# Altium footprint library BBC_Connectors.PcbLib: 142 footprints (part 7 of 9)
Each footprint in its own frame and in the unit in brackets; x right, y up, seen from the top. Pads: shape width x height; smd on the part's side, far side on the other; paste and mask are expansions set on the pad; w line width, h text height; cw(c..) or ccw(c..) is an arc to the next point about the centre after c.
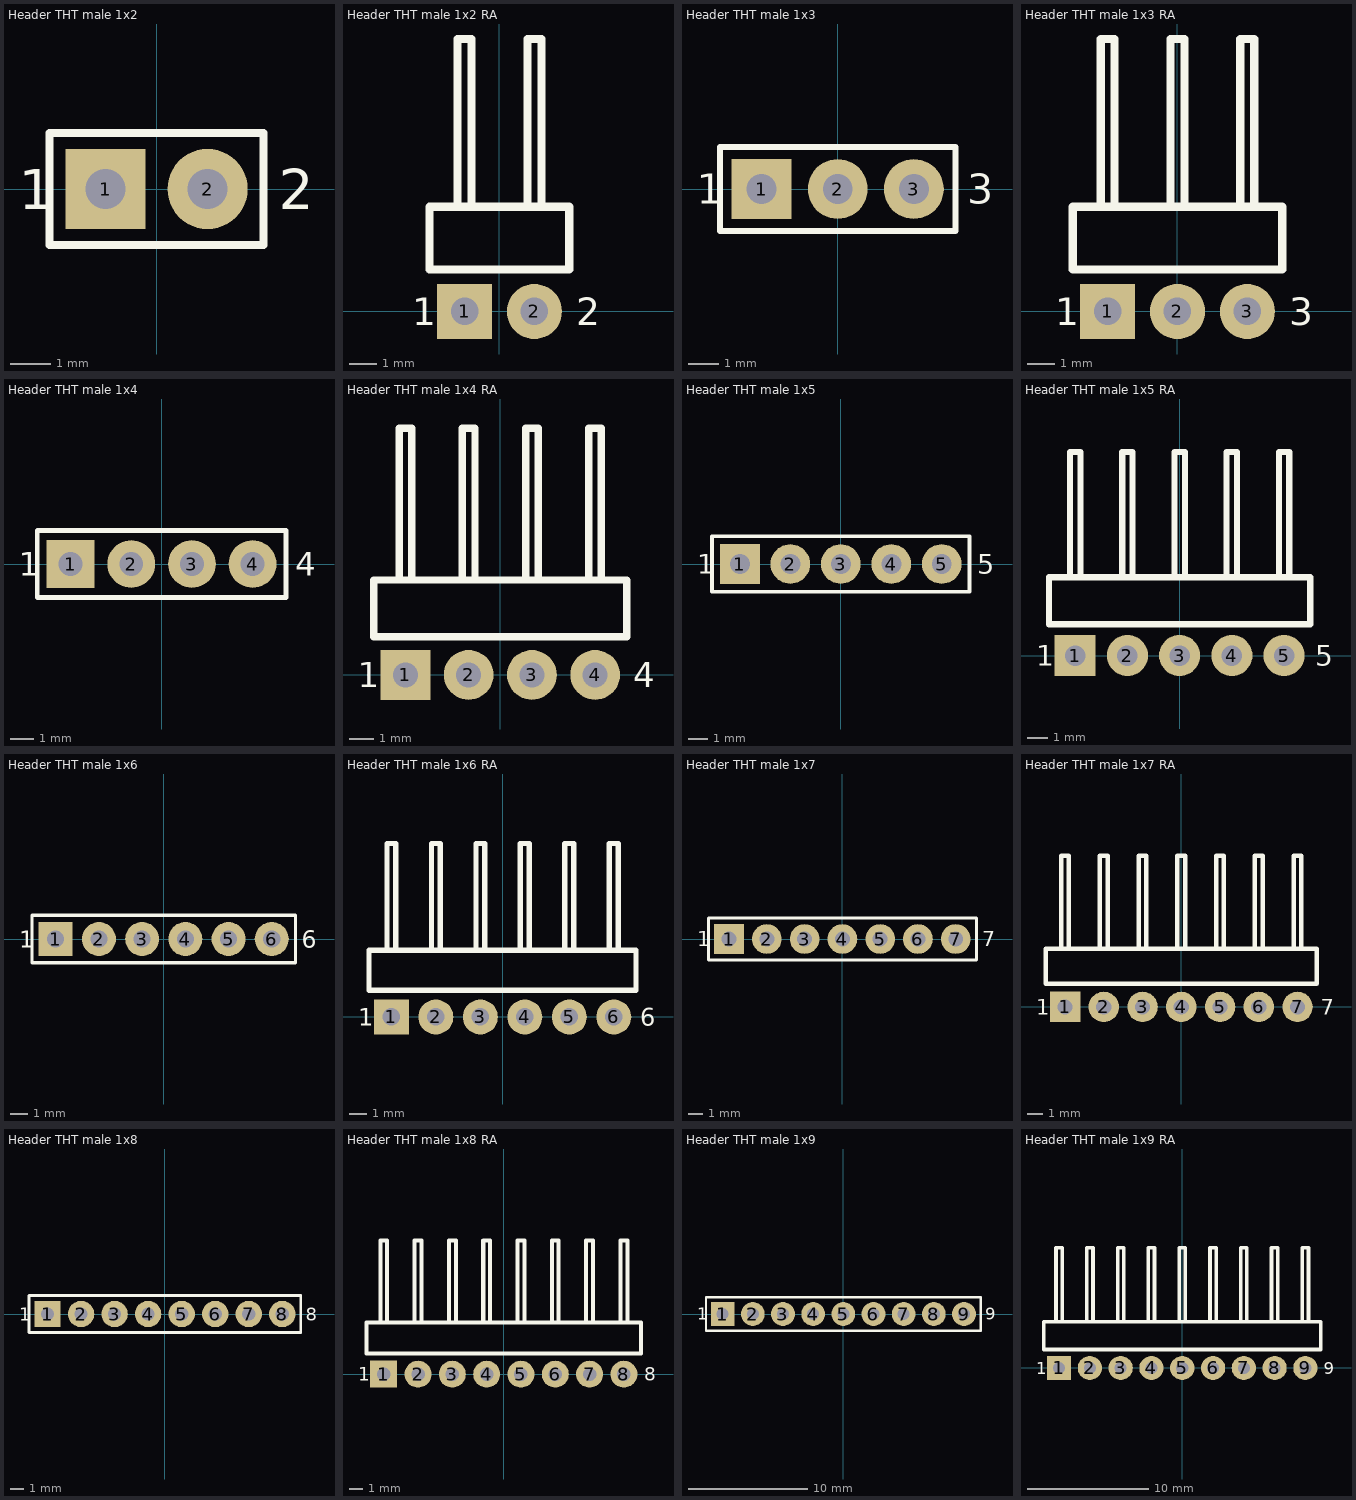
[diagram p6: the footprints below, top view; thin cyan lines are the x and y axes]

## Header THT male 1x2 [mm] "header for tht mounting / pitch = 2.54mm"
height 9
pads (2):
  rect 2x2 hole 1: 1(-1.27,0)
  round 2 hole 1: 2(1.27,0)
Top Overlay:
  lines w0.2: -2.667,-1.397 -2.667,1.397 2.667,1.397 2.667,-1.397 -2.667,-1.397
  text "1" at -3.429,-0.5 h1
  text "2" at 3.048,-0.5 h1
3D body: height 2.51, standoff -3, extent 2.54,3.81 2.54,3.81
3D body "Header THT 1x2.STEP": height 8.54, standoff -3, extent -2.54,-1.245 2.54,1.245

## Header THT male 1x2 RA [mm] "right angle header for tht mounting / pitch = 2.54mm"
height 2.5
pads (2):
  rect 2x2 hole 1: 1(-1.27,0)
  round 2 hole 1: 2(1.27,0)
Top Overlay:
  lines w0.3: -1.524,3.81 -1.524,9.906 -1.016,9.906 -1.016,3.81 ; 1.016,3.81 1.016,9.906 1.524,9.906 1.524,3.81 ; -2.54,1.524 2.54,1.524 2.54,3.81 -2.54,3.81 -2.54,1.524
  text "2" at 2.794,-0.5 h1
  text "1" at -3.175,-0.5 h1
3D body "Header THT 1x2 RA.STEP": height 2.51, standoff -3, extent -2.54,-0.32 2.54,9.81

## Header THT male 1x3 [mm] "header for tht mounting / pitch = 2.54mm"
height 9
pads (3):
  rect 2x2 hole 1: 1(-2.54,0)
  round 2 hole 1: 2(0,0) 3(2.54,0)
Top Overlay:
  lines w0.2: -3.937,-1.397 -3.937,1.397 3.937,1.397 3.937,-1.397 -3.937,-1.397
  text "3" at 4.318,-0.5 h1
  text "1" at -4.699,-0.5 h1
3D body: height 2.51, standoff -3, extent 2.54,3.81 2.54,3.81
3D body "Header THT 1x3.STEP": height 8.54, standoff -3, extent -3.81,-1.245 3.81,1.245

## Header THT male 1x3 RA [mm] "right angle header for tht mounting / pitch = 2.54mm"
height 2.5
pads (3):
  rect 2x2 hole 1: 1(-2.54,0)
  round 2 hole 1: 2(0,0) 3(2.54,0)
Top Overlay:
  lines w0.3: -2.794,3.81 -2.794,9.906 -2.286,9.906 -2.286,3.81 ; -0.254,3.81 -0.254,9.906 0.254,9.906 0.254,3.81 ; 2.286,3.81 2.286,9.906 2.794,9.906 2.794,3.81 ; -3.81,1.524 3.81,1.524 3.81,3.81 -3.81,3.81 -3.81,1.524
  text "1" at -4.445,-0.5 h1
  text "3" at 4.064,-0.5 h1
3D body "Header THT 1x3 RA.STEP": height 2.51, standoff -3, extent -3.81,-0.32 3.81,9.81

## Header THT male 1x4 [mm] "header for tht mounting / pitch = 2.54mm"
height 9
pads (4):
  rect 2x2 hole 1: 1(-3.81,0)
  round 2 hole 1: 2(-1.27,0) 3(1.27,0) 4(3.81,0)
Top Overlay:
  lines w0.2: -5.207,-1.397 5.207,-1.397 5.207,1.397 -5.207,1.397 -5.207,-1.397
  text "4" at 5.588,-0.5 h1
  text "1" at -5.969,-0.5 h1
3D body "Header THT male 1x4.STEP": height 8.54, standoff -3, extent -5.08,-1.245 5.08,1.245
3D body: height 2.51, standoff -3, extent 2.54,3.81 2.54,3.81

## Header THT male 1x4 RA [mm] "right angle header for tht mounting / pitch = 2.54mm"
height 2.5
pads (4):
  rect 2x2 hole 1: 1(-3.81,0)
  round 2 hole 1: 2(-1.27,0) 3(1.27,0) 4(3.81,0)
Top Overlay:
  lines w0.3: -4.064,3.81 -4.064,9.906 -3.556,9.906 -3.556,3.81 ; -1.524,3.81 -1.524,9.906 -1.016,9.906 -1.016,3.81 ; 1.016,3.81 1.016,9.906 1.524,9.906 1.524,3.81 ; 3.556,3.81 3.556,9.906 4.064,9.906 4.064,3.81 ; -5.08,1.524 -5.08,3.81 5.08,3.81 5.08,1.524 -5.08,1.524
  text "4" at 5.334,-0.5 h1
  text "1" at -5.715,-0.5 h1
3D body "Header THT 1x4 RA.STEP": height 2.51, standoff -3, extent -5.08,-0.32 5.08,9.81

## Header THT male 1x5 [mm] "header for tht mounting / pitch = 2.54mm"
height 9
pads (5):
  rect 2x2 hole 1: 1(-5.08,0)
  round 2 hole 1: 2(-2.54,0) 3(0,0) 4(2.54,0) 5(5.08,0)
Top Overlay:
  lines w0.2: -6.477,-1.397 -6.477,1.397 6.477,1.397 6.477,-1.397 -6.477,-1.397
  text "1" at -7.239,-0.5 h1
  text "5" at 6.858,-0.5 h1
3D body: height 2.51, standoff -3, extent 2.54,3.81 2.54,3.81
3D body "Header THT male 1x5.STEP": height 8.54, standoff -3, extent -6.35,-1.245 6.35,1.245

## Header THT male 1x5 RA [mm] "right angle header for tht mounting / pitch = 2.54mm"
height 2.5
pads (5):
  rect 2x2 hole 1: 1(-5.08,0)
  round 2 hole 1: 2(-2.54,0) 3(0,0) 4(2.54,0) 5(5.08,0)
Top Overlay:
  lines w0.3: -5.334,3.81 -5.334,9.906 -4.826,9.906 -4.826,3.81 ; -2.794,3.81 -2.794,9.906 -2.286,9.906 -2.286,3.81 ; -0.254,3.81 -0.254,9.906 0.254,9.906 0.254,3.81 ; 2.286,3.81 2.286,9.906 2.794,9.906 2.794,3.81 ; 4.826,3.81 4.826,9.906 5.334,9.906 5.334,3.81 ; -6.35,1.524 -6.35,3.81 6.35,3.81 6.35,1.524 -6.35,1.524
  text "5" at 6.604,-0.5 h1
  text "1" at -6.985,-0.5 h1
3D body "Header THT 1x5 RA.STEP": height 2.51, standoff -3, extent -6.35,-0.32 6.35,9.81

## Header THT male 1x6 [mm] "header for tht mounting / pitch = 2.54mm"
height 9
pads (6):
  rect 2x2 hole 1: 1(-6.35,0)
  round 2 hole 1: 2(-3.81,0) 3(-1.27,0) 4(1.27,0) 5(3.81,0) 6(6.35,0)
Top Overlay:
  lines w0.2: -7.747,-1.397 7.747,-1.397 7.747,1.397 -7.747,1.397 -7.747,-1.397
  text "1" at -8.509,-0.5 h1
  text "6" at 8.128,-0.5 h1
3D body: height 2.51, standoff -3, extent 2.54,3.81 2.54,3.81
3D body "Header THT 1x6.STEP": height 8.54, standoff -3, extent -7.62,-1.245 7.62,1.245

## Header THT male 1x6 RA [mm] "right angle header for tht mounting / pitch = 2.54mm"
height 2.5
pads (6):
  rect 2x2 hole 1: 1(-6.35,0)
  round 2 hole 1: 2(-3.81,0) 3(-1.27,0) 4(1.27,0) 5(3.81,0) 6(6.35,0)
Top Overlay:
  lines w0.3: -6.604,3.81 -6.604,9.906 -6.096,9.906 -6.096,3.81 ; -4.064,3.81 -4.064,9.906 -3.556,9.906 -3.556,3.81 ; -1.524,3.81 -1.524,9.906 -1.016,9.906 -1.016,3.81 ; 1.016,3.81 1.016,9.906 1.524,9.906 1.524,3.81 ; 3.556,3.81 3.556,9.906 4.064,9.906 4.064,3.81 ; 6.096,3.81 6.096,9.906 6.604,9.906 6.604,3.81 ; -7.62,1.524 7.62,1.524 7.62,3.81 -7.62,3.81 -7.62,1.524
  text "1" at -8.255,-0.5 h1
  text "6" at 7.874,-0.5 h1
3D body "Header THT 1x6 RA.STEP": height 2.51, standoff -3, extent -7.62,-0.32 7.62,9.81

## Header THT male 1x7 [mm] "header for tht mounting / pitch = 2.54mm"
height 9
pads (7):
  rect 2x2 hole 1: 1(-7.62,0)
  round 2 hole 1: 2(-5.08,0) 3(-2.54,0) 4(0,0) 5(2.54,0) 6(5.08,0) 7(7.62,0)
Top Overlay:
  lines w0.2: -9.017,-1.397 -9.017,1.397 9.017,1.397 9.017,-1.397 -9.017,-1.397
  text "7" at 9.398,-0.5 h1
  text "1" at -9.779,-0.5 h1
3D body "Header THT 1x7.STEP": height 8.54, standoff -3, extent -8.89,-1.245 8.89,1.245
3D body: height 2.51, standoff -3, extent 2.54,3.81 2.54,3.81

## Header THT male 1x7 RA [mm] "right angle header for tht mounting / pitch = 2.54mm"
height 2.5
pads (7):
  rect 2x2 hole 1: 1(-7.62,0)
  round 2 hole 1: 2(-5.08,0) 3(-2.54,0) 4(0,0) 5(2.54,0) 6(5.08,0) 7(7.62,0)
Top Overlay:
  lines w0.3: -7.874,3.81 -7.874,9.906 -7.366,9.906 -7.366,3.81 ; -5.334,3.81 -5.334,9.906 -4.826,9.906 -4.826,3.81 ; -2.794,3.81 -2.794,9.906 -2.286,9.906 -2.286,3.81 ; -0.254,3.81 -0.254,9.906 0.254,9.906 0.254,3.81 ; 2.286,3.81 2.286,9.906 2.794,9.906 2.794,3.81 ; 4.826,3.81 4.826,9.906 5.334,9.906 5.334,3.81 ; 7.366,3.81 7.366,9.906 7.874,9.906 7.874,3.81 ; -8.89,1.524 -8.89,3.81 8.89,3.81 8.89,1.524 -8.89,1.524
  text "7" at 9.144,-0.5 h1
  text "1" at -9.525,-0.5 h1
3D body "Header THT 1x7 RA.STEP": height 2.51, standoff -3, extent -8.89,-0.32 8.89,9.81

## Header THT male 1x8 [mm] "header for tht mounting / pitch = 2.54mm"
height 9
pads (8):
  rect 2x2 hole 1: 1(-8.89,0)
  round 2 hole 1: 2(-6.35,0) 3(-3.81,0) 4(-1.27,0) 5(1.27,0) 6(3.81,0) 7(6.35,0) 8(8.89,0)
Top Overlay:
  lines w0.2: -10.287,-1.397 10.287,-1.397 10.287,1.397 -10.287,1.397 -10.287,-1.397
  text "8" at 10.668,-0.5 h1
  text "1" at -11.049,-0.5 h1
3D body: height 2.51, standoff -3, extent 2.54,3.81 2.54,3.81
3D body "Header THT 1x8.STEP": height 8.54, standoff -3, extent -10.16,-1.245 10.16,1.245

## Header THT male 1x8 RA [mm] "right angle header for tht mounting / pitch = 2.54mm"
height 2.5
pads (8):
  rect 2x2 hole 1: 1(-8.89,0)
  round 2 hole 1: 2(-6.35,0) 3(-3.81,0) 4(-1.27,0) 5(1.27,0) 6(3.81,0) 7(6.35,0) 8(8.89,0)
Top Overlay:
  lines w0.3: -9.144,3.81 -9.144,9.906 -8.636,9.906 -8.636,3.81 ; -6.604,3.81 -6.604,9.906 -6.096,9.906 -6.096,3.81 ; -4.064,3.81 -4.064,9.906 -3.556,9.906 -3.556,3.81 ; -1.524,3.81 -1.524,9.906 -1.016,9.906 -1.016,3.81 ; 1.016,3.81 1.016,9.906 1.524,9.906 1.524,3.81 ; 3.556,3.81 3.556,9.906 4.064,9.906 4.064,3.81 ; 6.096,3.81 6.096,9.906 6.604,9.906 6.604,3.81 ; 8.636,3.81 8.636,9.906 9.144,9.906 9.144,3.81 ; -10.16,1.524 10.16,1.524 10.16,3.81 -10.16,3.81 -10.16,1.524
  text "1" at -10.795,-0.5 h1
  text "8" at 10.414,-0.5 h1
3D body "Header THT 1x8 RA.STEP": height 2.51, standoff -3, extent -10.16,-0.32 10.16,9.81

## Header THT male 1x9 [mm] "header for tht mounting / pitch = 2.54mm"
height 9
pads (9):
  rect 2x2 hole 1: 1(-10.16,0)
  round 2 hole 1: 2(-7.62,0) 3(-5.08,0) 4(-2.54,0) 5(0,0) 6(2.54,0) 7(5.08,0) 8(7.62,0) 9(10.16,0)
Top Overlay:
  lines w0.2: -11.557,-1.397 11.557,-1.397 11.557,1.397 -11.557,1.397 -11.557,-1.397
  text "9" at 11.938,-0.5 h1
  text "1" at -12.319,-0.5 h1
3D body "Header THT 1x9.STEP": height 8.54, standoff -3, extent -11.43,-1.245 11.43,1.245
3D body: height 2.51, standoff -3, extent 2.54,3.81 2.54,3.81

## Header THT male 1x9 RA [mm] "right angle header for tht mounting / pitch = 2.54mm"
height 2.5
pads (9):
  rect 2x2 hole 1: 1(-10.16,0)
  round 2 hole 1: 2(-7.62,0) 3(-5.08,0) 4(-2.54,0) 5(0,0) 6(2.54,0) 7(5.08,0) 8(7.62,0) 9(10.16,0)
Top Overlay:
  lines w0.3: -10.414,3.81 -10.414,9.906 -9.906,9.906 -9.906,3.81 ; -7.874,3.81 -7.874,9.906 -7.366,9.906 -7.366,3.81 ; -5.334,3.81 -5.334,9.906 -4.826,9.906 -4.826,3.81 ; -2.794,3.81 -2.794,9.906 -2.286,9.906 -2.286,3.81 ; -0.254,3.81 -0.254,9.906 0.254,9.906 0.254,3.81 ; 2.286,3.81 2.286,9.906 2.794,9.906 2.794,3.81 ; 4.826,3.81 4.826,9.906 5.334,9.906 5.334,3.81 ; 7.366,3.81 7.366,9.906 7.874,9.906 7.874,3.81 ; 9.906,3.81 9.906,9.906 10.414,9.906 10.414,3.81 ; -11.43,1.524 -11.43,3.81 11.43,3.81 11.43,1.524 -11.43,1.524
  text "9" at 11.684,-0.5 h1
  text "1" at -12.065,-0.5 h1
3D body "Header THT 1x9 RA.STEP": height 2.51, standoff -3, extent -11.43,-0.32 11.43,9.81